# Altium footprint library CADTlink.PcbLib: 143 footprints (part 7 of 9)
Each footprint in its own frame and in the unit in brackets; x right, y up, seen from the top. Pads: shape width x height; smd on the part's side, far side on the other; paste and mask are expansions set on the pad; w line width, h text height; cw(c..) or ccw(c..) is an arc to the next point about the centre after c.
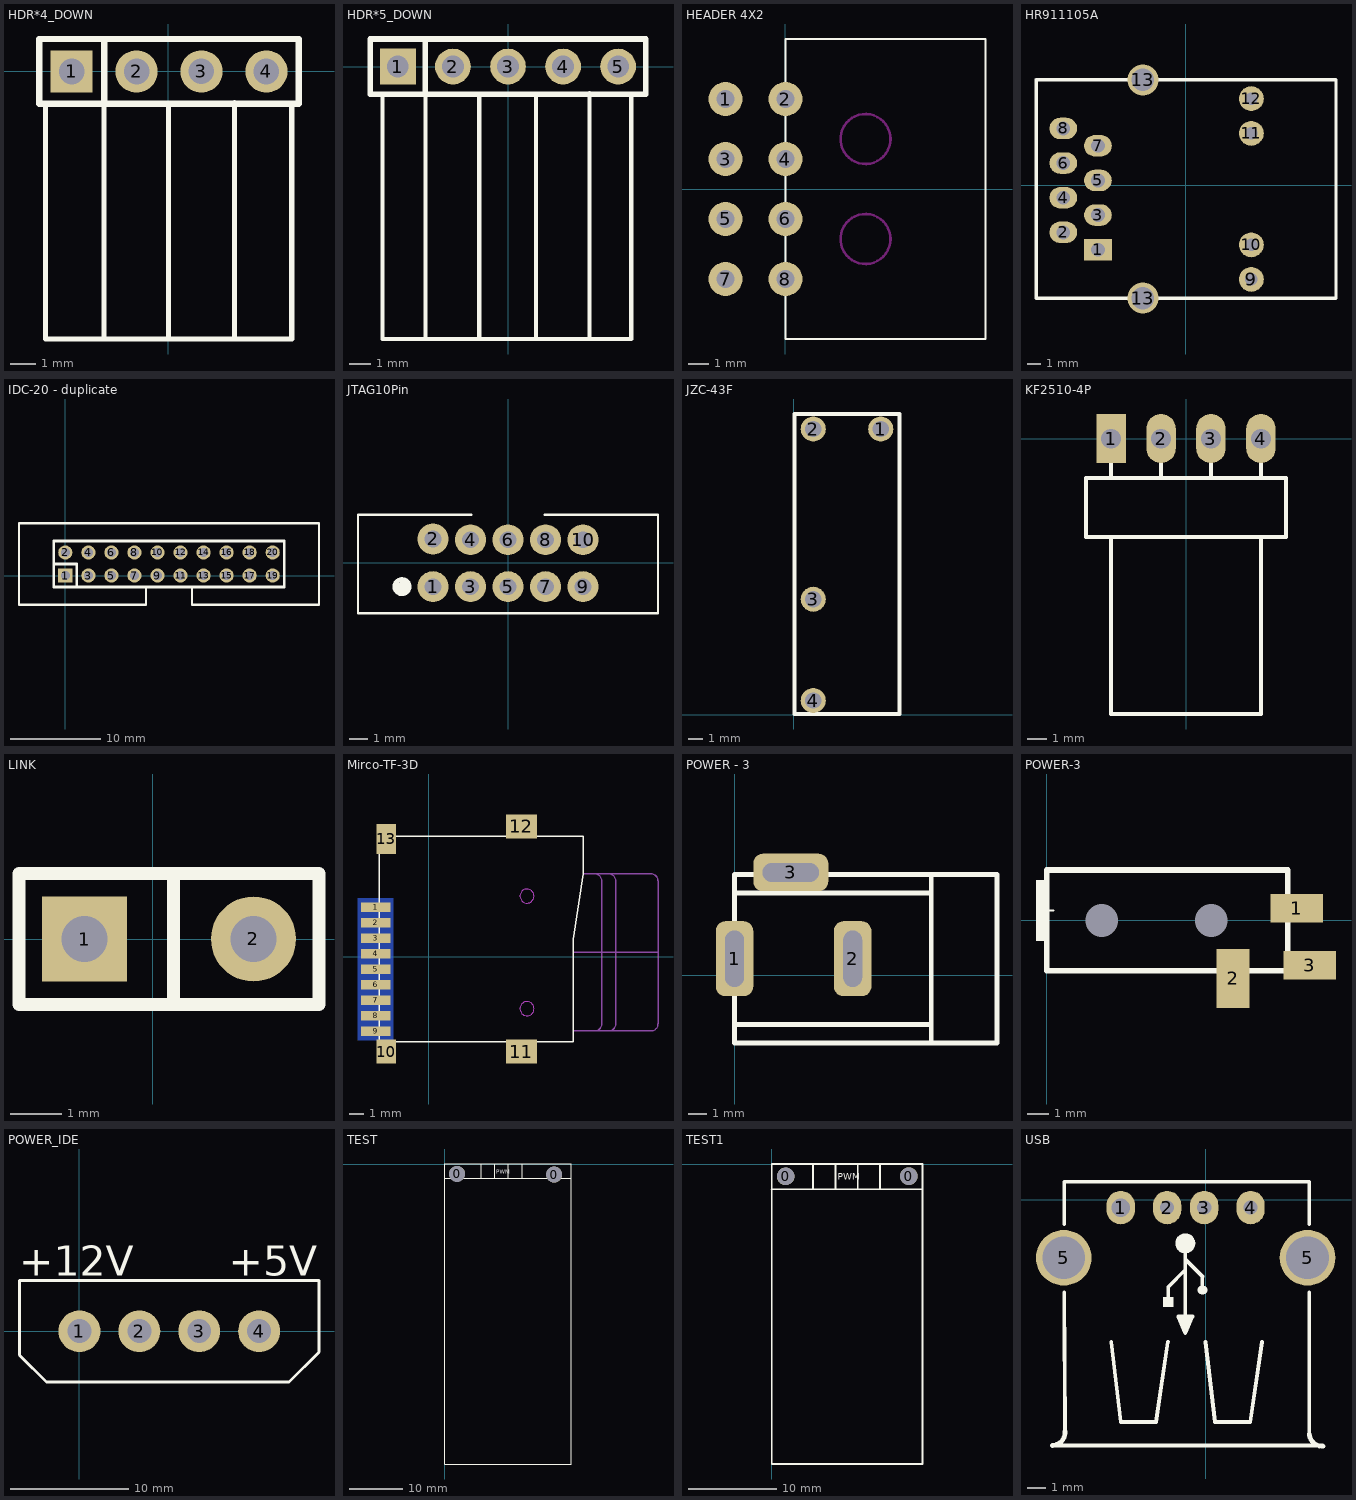
[diagram p6: the footprints below, top view; thin cyan lines are the x and y axes]

## HDR*4_DOWN [mm]
pads (4):
  rect 1.65x1.65 hole 1: 1(-3.785,0)
  round 1.65 hole 1: 2(-1.245,0) 3(1.295,0) 4(3.835,0)
Top Overlay:
  lines w0.2: -4.801,-1.27 -4.801,-10.465 4.826,-10.465 4.826,-1.27 ; -2.515,-10.465 -2.515,-1.27 ; 0,-10.414 0,-1.245 ; 2.591,-10.439 2.591,-1.219
  lines w0.254: -2.515,-1.27 -2.515,1.27 ; -5.055,-1.27 -5.055,1.27 5.105,1.27 5.105,-1.27 -5.055,-1.27
3D body: height 1.27, standoff -1.27, extent -5.054,-10.343 5.106,1.197

## HDR*5_DOWN [mm]
pads (5):
  rect 1.65x1.65 hole 1: 1(-5.08,0)
  round 1.65 hole 1: 2(-2.54,0) 3(0,0) 4(2.54,0) 5(5.08,0)
Top Overlay:
  lines w0.2: -5.792,-1.27 -5.792,-12.573 5.689,-12.573 5.689,-1.27 ; -3.81,-12.549 -3.81,-1.27 ; -1.322,-12.548 -1.322,-1.321 ; 1.294,-12.573 1.294,-1.27 ; 3.758,-12.573 3.758,-1.219
  lines w0.254: -3.81,-1.27 -3.81,1.27 ; -6.35,-1.27 6.35,-1.27 6.35,1.27 -6.35,1.27 -6.35,-1.27
3D body: height 1.27, standoff -1.27, extent -6.375,-10.496 6.325,1.044

## HEADER 4X2 [mm]
pads (8):
  round 1.7 hole 0.9: 1(-2.986,4.507) 2(0.014,4.507) 3(-2.986,1.507) 4(0.014,1.507) 5(-2.986,-1.493) 6(0.014,-1.493) 7(-2.986,-4.493) 8(0.014,-4.493)
Top Overlay:
  lines w0.1: 0.014,-7.493 0.014,7.507 10.014,7.507 10.014,-7.493 0.014,-7.493
Keep-Out Layer:
  circle w0.127: c4.014,-2.493 r1.25
  circle w0.127: c4.014,2.507 r1.25

## HR911105A [mil]
pads (14):
  rect 80x62 hole 40: 1(-252.91,-186)
  oval 80x62 hole 40: 2(-352.91,-136) 3(-252.91,-86) 4(-352.91,-36) 5(-252.91,14) 6(-352.91,64) 7(-252.91,114) 8(-352.91,164)
  round 72 hole 36: 9(190,-271.63) 10(190,-172) 11(190,149.87) 12(190,250)
  round 90 hole 65: 13(-122.99,-325.76) 13(-122.99,304.16)
Top Overlay:
  lines w10: -431.65,-326 -431.57,-325.92 -123.15,-325.92 ; -431.65,304 -431.5,304.16 ; -431.42,-325.76 -431.5,-325.69 -431.5,304.16 ; -122.99,-325.76 434.25,-325.76 434.49,-326 434.49,304 -122.83,304 ; -122.99,304.16 -431.5,304.16 ; -114.24,-318.92 -114.08,-318.76 ; -114.08,311.16 -113.92,311
Multi-Layer:
  circle w5: c7.09,214 r70.8
  circle w5: c7.09,-236 r70.8

## IDC-20 - duplicate [mil]
pads (20):
  rect 62x62 hole 39.37: 1(0,0)
  round 62 hole 39.37: 2(0,100) 3(100,0) 4(100,100) 5(200,0) 6(200,100) 7(300,0) 8(300,100) 9(400,0) 10(400,100) 11(500,0) 12(500,100) 13(600,0) 14(600,100) 15(700,0) 16(700,100) 17(800,0) 18(800,100) 19(900,0) 20(900,100)
Top Overlay:
  lines w10: 350,-50 350,-127.17 -201.18,-127.17 -201.18,227.16 1101.18,227.16 1101.18,-127.17 550,-127.17 550,-50
  lines w12: -50,50 50,50 50,-50 ; -50,-50 -50,150 950,150 950,-50 -50,-50
3D body: height 352.36, standoff -114.17, extent -201,-123.27 1099,235

## JTAG10Pin [mil]
pads (10):
  round 65 hole 35: 1(-157.48,-50) 2(-157.48,50) 3(-78.74,-50) 4(-78.74,48.43) 5(0,-50) 6(0,48.43) 7(78.74,-50) 8(78.74,48.43) 9(157.48,-50) 10(157.48,48.43)
Top Overlay:
  circle w10: c-222.48,-50 r5
  circle w10: c-222.48,-50 r15
  lines w5: -77.48,101 -314.96,101 -314.96,-106 314.96,-106 314.96,101 77.52,101
3D body: height 11.81, standoff 0, extent -303.96,-94.96 301,90
3D body: height 236.22, standoff 0, extent -314.94,-105.98 314.94,100.98
3D body: height 196.85, standoff -78.74, extent -173.46,-65.98 -141.5,-34.02
3D body: height 196.85, standoff -78.74, extent -94.72,-65.98 -62.76,-34.02
3D body: height 196.85, standoff -78.74, extent -15.98,-65.98 15.98,-34.02
3D body: height 196.85, standoff -78.74, extent 62.77,-65.98 94.72,-34.02
3D body: height 196.85, standoff -78.74, extent 141.51,-65.98 173.47,-34.02
3D body: height 196.85, standoff -78.74, extent 141.51,32.45 173.47,64.41
3D body: height 196.85, standoff -78.74, extent 62.77,32.45 94.72,64.41
3D body: height 196.85, standoff -78.74, extent -15.98,32.45 15.98,64.41
3D body: height 196.85, standoff -78.74, extent -94.72,32.45 -62.76,64.41
3D body: height 196.85, standoff -78.74, extent -173.46,34.02 -141.5,65.98

## JZC-43F [mm]
pads (4):
  round 1.7 hole 1.1: 1(5.89,19.344) 2(1.318,19.344) 3(1.318,7.812) 4(1.318,0.954)
Top Overlay:
  lines w0.254: 0.048,0.04 0.048,20.36 7.16,20.36 7.16,0.04 0.048,0.04
3D body: height 15.6, standoff -2.9, extent 0.087,0.062 7.087,20.562

## KF2510-4P [mm] "POWER"
pads (4):
  rect 1.5x2.5 hole 1: 1(-3.81,0)
  oval 1.5x2.5 hole 1: 2(-1.27,0) 3(1.27,0) 4(3.81,0)
Top Overlay:
  lines w0.2: -3.81,-5 -3.81,-14 3.81,-14 3.81,-5 ; -3.81,-2 -3.81,0 ; -1.27,-2 -1.27,0 ; 1.27,-2 1.27,0 ; 3.81,-2 3.81,0 ; -5.08,-5 -5.08,-2 5.08,-2 5.08,-5 -5.08,-5
3D body: height 5.99, standoff -3.41, extent -4.897,-14.235 4.783,0.245

## LINK [mm]
pads (2):
  rect 1.65x1.65 hole 0.9: 1(-1.321,0)
  round 1.65 hole 0.9: 2(1.956,0)
Top Overlay:
  lines w0.254: 0.406,-1.27 0.406,1.27 ; -2.591,-1.27 -2.591,1.27 3.226,1.27 3.226,-1.27 -2.591,-1.27

## Mirco-TF-3D [mm]
pads (13):
  rect 2.1x0.7 smd: 1(-3.777,3.52) 2(-3.777,2.42) 3(-3.777,1.32) 4(-3.777,0.22) 5(-3.777,-0.88) 6(-3.777,-1.98) 7(-3.777,-3.08) 8(-3.777,-4.18) 9(-3.777,-5.28)
  rect 1.4x1.7 smd: 10(-3.027,-6.73)
  rect 2.2x1.7 smd: 11(6.573,-6.73) 12(6.573,9.27)
  rect 1.4x2.1 smd: 13(-3.027,8.37)
Bottom Layer:
  pour cut-out: -5.027,-5.93 -5.027,4.17 -2.527,4.17 -2.527,-5.93
Top Overlay:
  lines w0.1: 10.973,5.9 10.273,1.27 10.273,-6.03 -3.527,-6.03 -3.527,8.57 10.973,8.57 10.973,5.92
Keep-Out Layer:
  circle w0.01: c6.973,4.32 r0.5
  circle w0.01: c6.973,-3.68 r0.5
Mechanical 1:
  lines w0.1: 10.273,-5.26 15.773,-5.26 ccw(c15.773,-4.76) 16.273,-4.76 16.273,5.4 ccw(c15.773,5.4) 15.773,5.9 10.973,5.9 ; 10.273,0.32 16.273,0.32 ; 11.773,-5.26 ccw(c11.773,-4.76) 12.273,-4.76 12.273,5.4 ccw(c11.773,5.4) 11.773,5.9 ; 12.773,-5.26 ccw(c12.773,-4.76) 13.273,-4.76 13.273,5.4 ccw(c12.773,5.4) 12.773,5.9
Mechanical 2:
  circle w0.01: c6.973,-3.68 r0.5
  circle w0.01: c6.973,4.32 r0.5
3D body: height 1.85, standoff -0.6, extent -4.323,-6.731 10.927,9.269

## POWER - 3 [mm]
pads (3):
  rrect50% 2x4 hole 1 slot 3 at 90 deg: 1(0,0.889) 2(6.3,0.889)
  rrect50% 4x2 hole 1 slot 3 at 0 deg: 3(3,5.489)
Top Overlay:
  lines w0.254: 0,-2.616 10.49,-2.616 ; 0,4.394 10.49,4.394 ; 10.49,-3.607 10.49,5.385 ; 0,-3.607 13.995,-3.607 13.995,5.385 0,5.385 0,-3.607
3D body: height 11.02, standoff -3.48, extent -0.043,-3.614 13.783,5.892

## POWER-3 [mm]
pads (5):
  round 0 hole 1.5 mask+0: 0(2.5,0) 0(7.5,0)
  rect 2.4x1.3 smd: 1(11.4,0.55) 3(12,-2.05)
  rect 1.5x2.7 smd: 2(8.5,-2.65)
Top Overlay:
  rectangle: -0.5,-0.95 0.1,1.85
  lines w0.1: -0.2,0.45 0.3,0.45
  lines w0.254: 0,-2.3 0,2.3 11,2.3 11,-2.3 0,-2.3
3D body: height 4.4, standoff -0.8, extent 0.025,-3.875 12.625,2.425

## POWER_IDE [mil]
pads (4):
  round 140 hole 80: 1(0,0) 2(200,0) 3(400,0) 4(600,0)
Top Overlay:
  lines w10: 640,-170 700,-170 ; 800,-40 800,-70 ; 700,-170 -110,-170 -200,-80 -200,170 800,170 800,-70 ; 700,-170 800,-70
  text "+5V" at 498,185 h100
  text "+12V" at -202,185 h100
3D body: height 480, standoff 0, extent -158,-174 762,176

## TEST [mm]
pads (2):
  round 3 hole 3: 0(2.337,-1.803) 0(20.523,-1.956)
Top Overlay:
  lines w0.203: 0,-2.616 23.749,-2.616 ; 6.883,-2.616 6.883,0.025 ; 9.423,-2.616 9.423,0.025 ; 11.963,-2.616 11.963,0.025 ; 14.503,-2.616 14.503,0.025 ; 0,-56.109 0,0.025 23.749,0.025 23.749,-56.109 0,-56.109
  text "PWM" at 9.677,-1.778 h0.76

## TEST1 [mm]
pads (2):
  round 2 hole 2: 0(1.575,-1.372) 0(15.545,-1.346)
Top Overlay:
  lines w0.203: -0.025,-2.845 17.069,-2.845 ; 4.674,-2.819 4.674,0.025 ; 7.214,-2.845 7.214,0.025 ; 9.754,-2.819 9.754,0.025 ; 12.294,-2.845 12.294,0.025 ; 0,-34 17.094,-34 17.094,0.025 0,0.025 0,-34
  text "PWM" at 7.468,-1.778 h0.76

## USB [mil]
pads (6):
  oval 60x70.87 hole 39.37: 1(-180,-17)
  oval 60x70.87 hole 30: 2(-81.58,-17) 3(-2.83,-17) 4(95.59,-17)
  round 118.11 hole 90.55: 5(-300.87,-123.69) 5(216.46,-123.69)
Top Overlay:
  circle w20: c-43,-93 r11.18
  rectangle: -90,-228 -68,-207
  lines w8: -325,-522 248.19,-522 ; -300,-197 -298.19,-492 ; -300,-52 -300,38 220,38 220,-52 ; -200,-302 -180,-472 -105,-472 -80,-302 ; -79,-208 -79,-185 -43,-149 ; -43,-168 -43,-167 ; -43,-93 -43,-283 ; -42.73,-127.27 -6.73,-163.27 ; -7,-183 -7,-164 ; 0,-302 20,-472 95,-472 120,-302 ; 220,-497 220,-197 ; -43,-283 -28,-248 -58,-248 -43,-283
  lines w10: -325,-522 ccw(c-326.6,-493.59) -298.19,-492 ; 220,-497 ccw(c248.41,-495.41) 250,-523.81
  lines w20: -43,-268 -43,-253 ; -7,-192 -6,-192